# Altium footprint library EMDC_Packages.PcbLib: 274 footprints (part 2 of 18)
Each footprint in its own frame and in the unit in brackets; x right, y up, seen from the top. Pads: shape width x height; smd on the part's side, far side on the other; paste and mask are expansions set on the pad; w line width, h text height; cw(c..) or ccw(c..) is an arc to the next point about the centre after c.
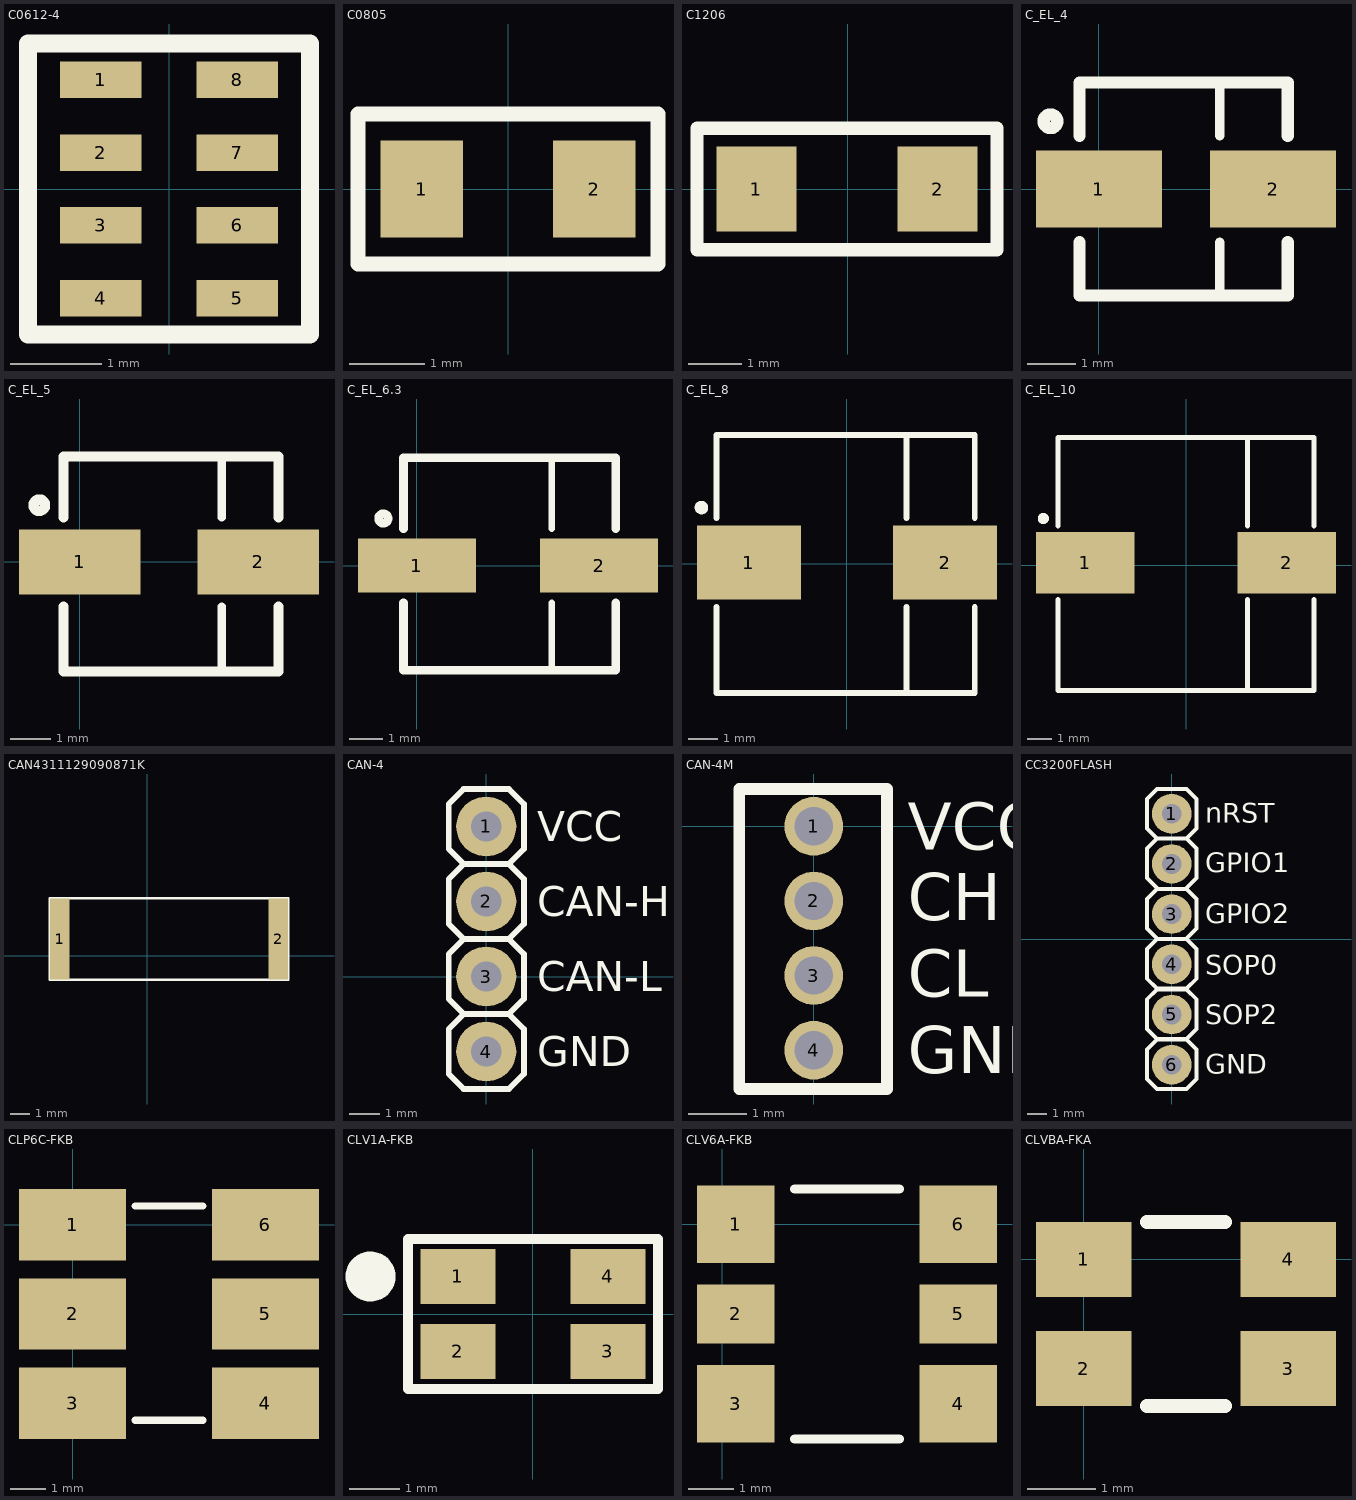
[diagram p1: the footprints below, top view; thin cyan lines are the x and y axes]

## C0612-4 [mm] "Capacitor array (4 caps)"
pads (8):
  rect 0.9x0.4 smd: 1(-0.75,1.2) 2(-0.75,0.4) 3(-0.75,-0.4) 4(-0.75,-1.2) 5(0.75,-1.2) 6(0.75,-0.4) 7(0.75,0.4) 8(0.75,1.2)
Top Overlay:
  lines w0.2: -1.55,-1.6 1.55,-1.6 1.55,1.6 -1.55,1.6 -1.55,-1.6
3D body "User Library-Array-1206-4Way-Var1.STEP": height 0.5, standoff 0, extent -0.8,-1.6 0.8,1.6

## C0805 [mm]
pads (2):
  rect 1.1x1.3 smd: 1(-1.15,0) 2(1.15,0)
Top Overlay:
  lines w0.2: -2,-1 2,-1 2,1 -2,1 -2,-1
3D body "User Library-CRS0805.STEP": height 0.5, standoff 0, extent -1,-0.625 1,0.625

## C1206 [mm]
pads (2):
  rect 1.52x1.6 smd: 1(-1.725,0) 2(1.7,0)
Top Overlay:
  lines w0.254: -2.85,-1.15 2.825,-1.15 2.825,1.15 -2.85,1.15 -2.85,-1.15
3D body "User Library-Chip Cap_MLCC_1206 (3216)_C.STEP": height 0.95, standoff 0, extent -1.6,-0.8 1.6,0.8

## C_EL_4 [mm]
pads (2):
  rect 2.6x1.6 smd: 1(0,0) 2(3.6,0)
Top Overlay:
  circle w0.254: c-1,1.4 r0.141
  lines w0.2: 2.5,-2.2 2.5,-1.1 ; 2.5,1.1 2.5,2.2
  lines w0.254: 3.9,-1.1 3.9,-2.2 -0.4,-2.2 -0.4,-1.1 ; 3.9,1.1 3.9,2.2 -0.4,2.2 -0.4,1.1 ; -0.4,-1.1 -0.4,-1.1 ; -0.4,1.1 -0.4,1.1
3D body "User Library-CAPSMD4x3_9.STEP": height 3.91, standoff 0, extent -0.55,-2.175 4.05,2.125

## C_EL_5 [mm]
pads (2):
  rect 3x1.6 smd: 1(0,0) 2(4.4,0)
Top Overlay:
  circle w0.254: c-1,1.4 r0.141
  lines w0.2: 3.5,-2.7 3.5,-1.1 ; 3.5,1.1 3.5,2.6
  lines w0.254: 4.9,-1.1 4.9,-2.7 -0.4,-2.7 -0.4,-1.1 ; 4.9,1.1 4.9,2.6 -0.4,2.6 -0.4,1.1 ; -0.4,-1.1 -0.4,-1.1 ; -0.4,1.1 -0.4,1.1
3D body "User Library-CAP SMD SVP 5_0x5_9.STEP": height 5.9, standoff 0, extent -0.8,-2.65 5.2,2.65

## C_EL_6.3 [mm]
pads (2):
  rect 3.5x1.6 smd: 1(0,0) 2(5.4,0)
Top Overlay:
  circle w0.254: c-1,1.4 r0.141
  lines w0.2: 4,-3.1 4,-1.1 ; 4,1.1 4,3.2
  lines w0.254: -0.4,-1.1 -0.4,-3.1 5.9,-3.1 5.9,-1.1 ; -0.4,1.1 -0.4,3.2 5.9,3.2 5.9,1.1
3D body "User Library-CEL63D66S8H.STEP": height 7.9, standoff 0.2, extent -0.775,-3.3 6.225,3.3

## C_EL_8 [mm]
pads (2):
  rect 3.5x2.5 smd: 1(-3.3,0.05) 2(3.3,0.05)
Top Overlay:
  circle w0.254: c-4.9,1.9 r0.1
  lines w0.2: -4.4,-1.45 -4.4,-4.35 4.3,-4.35 4.3,-1.45 ; -4.4,1.55 -4.4,4.35 4.3,4.35 4.3,1.55 ; 2,-4.35 2,-1.45 ; 2,1.55 2,4.35
3D body "User Library-CAP SMD SVP 8_0x6_9.STEP": height 6.9, standoff 0, extent -4.5,-4.15 4.5,4.15

## C_EL_10 [mm]
pads (2):
  rect 4x2.5 smd: 1(-4.1,0.1) 2(4.1,0.1)
Top Overlay:
  circle w0.254: c-5.8,1.9 r0.1
  lines w0.2: -5.2,-1.4 -5.2,-5.1 5.2,-5.1 5.2,-1.4 ; -5.2,1.6 -5.2,5.2 5.2,5.2 5.2,1.6 ; 2.5,-5.1 2.5,-1.4 ; 2.5,1.6 2.5,5.2
3D body "User Library-CAP SMD SVP 10_0x12_6.STEP": height 12.6, standoff 0, extent -5.5,-5.15 5.5,5.15

## CAN4311129090871K [mm]
pads (2):
  rect 1x4.25 smd: 1(-4.575,0.875) 2(6.825,0.875)
Top Overlay:
  lines w0.15: -5.075,-1.25 7.325,-1.25 7.325,3 -5.075,3 -5.075,-1.25
3D body "User Library-Yageo ANT1204LL08R0870A Ceramic Chip Antenna.step": height 1.6, standoff 0, extent -4.925,-1.175 7.175,2.925

## CAN-4 [mm]
pads (4):
  round 2 hole 1: 1(0,5) 2(0,2.5) 3(0,0) 4(0,-2.5)
Top Overlay:
  lines w0.2: -0.75,-1.25 0.75,-1.25 ; -0.75,-1.25 -1.25,-0.75 -1.25,0.75 -0.75,1.25 ; -0.75,-1.25 -1.25,-1.75 -1.25,-3.25 -0.75,-3.75 0.75,-3.75 1.25,-3.25 1.25,-1.75 0.75,-1.25 ; -0.75,1.25 -1.25,1.75 -1.25,3.25 -0.75,3.75 ; -0.75,1.25 0.75,1.25 ; -0.75,3.75 0.75,3.75 ; -0.75,3.75 -1.25,4.25 -1.25,5.75 -0.75,6.25 0.75,6.25 1.25,5.75 1.25,4.25 0.75,3.75 ; 0.75,-1.25 1.25,-0.75 1.25,0.75 0.75,1.25 ; 0.75,1.25 1.25,1.75 1.25,3.25 0.75,3.75
  text "GND" at 1.7,-3 h1
  text "CAN-L" at 1.7,-0.5 h1
  text "VCC" at 1.7,4.5 h1
  text "CAN-H" at 1.7,2 h1
3D body "User Library-PLS-1.STEP": height 8.44, standoff -3, extent -1.27,-3.77 1.27,-1.23
3D body "User Library-PLS-1.STEP": height 8.44, standoff -3, extent -1.27,-1.27 1.27,1.27
3D body "User Library-PLS-1.STEP": height 8.44, standoff -3, extent -1.27,1.23 1.27,3.77
3D body "User Library-PLS-1.STEP": height 8.44, standoff -3, extent -1.27,3.73 1.27,6.27

## CAN-4M [mm]
pads (4):
  round 1 hole 0.65: 1(0,0) 2(0,-1.27) 3(0,-2.54) 4(0,-3.81)
Top Overlay:
  lines w0.2: -1.27,-4.47 1.245,-4.47 1.245,0.635 -1.27,0.635 -1.27,-4.47
  text "VCC" at 1.6,-0.4 h0.8
  text "CH" at 1.6,-1.6 h0.8
  text "CL" at 1.6,-2.9 h0.8
  text "GND" at 1.6,-4.2 h0.8
3D body "PLL-2.stp": height 5.2, standoff -2.9, extent -1.1,-4.64 1.1,-1.69
3D body "PLL-2.stp": height 5.2, standoff -2.9, extent -1.1,-2.1 1.1,0.85

## CC3200FLASH [mm]
pads (6):
  round 2 hole 1: 1(0,6.35) 2(0,3.81) 3(0,1.27) 4(0,-1.27) 5(0,-3.81) 6(0,-6.35)
Top Overlay:
  lines w0.2: -0.75,0.04 -1.25,0.54 -1.25,2.04 -0.75,2.54 0.75,2.54 1.25,2.04 1.25,0.54 0.75,0.04 ; -0.75,2.6 -1.25,3.1 -1.25,4.6 -0.75,5.1 ; 0.75,2.6 1.25,3.1 1.25,4.6 0.75,5.1 ; -0.75,5.1 -1.25,5.6 -1.25,7.1 -0.75,7.6 0.75,7.6 1.25,7.1 1.25,5.6 0.75,5.1 ; -0.75,5.1 0.75,5.1 ; -1.25,-7.08 -1.25,-5.58 -0.75,-5.08 0.75,-5.08 1.25,-5.58 1.25,-7.08 0.75,-7.58 -0.75,-7.58 -1.25,-7.08 ; -1.25,-4.54 -0.75,-5.04 0.75,-5.04 1.25,-4.54 1.25,-3.04 0.75,-2.54 -0.75,-2.54 -1.25,-3.04 -1.25,-4.54 ; -1.25,-2 -1.25,-0.5 -0.75,0 0.75,0 1.25,-0.5 1.25,-2 0.75,-2.5 -0.75,-2.5 -1.25,-2
  text "GND" at 1.7,-6.8 h1
  text "SOP2" at 1.7,-4.3 h1
  text "SOP0" at 1.7,-1.8 h1
  text "GPIO2" at 1.7,0.8 h1
  text "GPIO1" at 1.7,3.4 h1
  text "nRST" at 1.7,5.9 h1
3D body "User Library-PLS-1.STEP": height 8.44, standoff -3, extent -1.27,5.08 1.27,7.62
3D body "User Library-PLS-1.STEP": height 8.44, standoff -3, extent -1.27,2.54 1.27,5.08
3D body "User Library-PLS-1.STEP": height 8.44, standoff -3, extent -1.27,0 1.27,2.54
3D body "User Library-PLS-1.STEP": height 8.44, standoff -3, extent -1.27,-2.54 1.27,0
3D body "User Library-PLS-1.STEP": height 8.44, standoff -3, extent -1.27,-5.08 1.27,-2.54
3D body "User Library-PLS-1.STEP": height 8.44, standoff -3, extent -1.27,-7.62 1.27,-5.08

## CLP6C-FKB [mm] "RGB LED Cree CLP6C-FKB"
pads (6):
  rect 3x2 smd: 1(0,0) 2(0,-2.5) 3(0,-5) 4(5.4,-5) 5(5.4,-2.5) 6(5.4,0)
Top Overlay:
  lines w0.2: 1.75,-5.475 3.65,-5.475 ; 1.75,0.525 3.65,0.525

## CLV1A-FKB [mm] "RGB LED Cree CLV1A-FKB"
pads (4):
  rect 1.5x1.1 smd: 1(-1.5,0.75) 2(-1.5,-0.75) 3(1.5,-0.75) 4(1.5,0.75)
Top Overlay:
  circle w0.5: c-3.25,0.75 r0.25
  lines w0.2: -2.5,-1.5 -2.5,1.5 2.5,1.5 2.5,-1.5 -2.5,-1.5
3D body "User Library-PLCC4RGBCT-CA LED SMD RGB.step": height 1.88, standoff -0.02, extent -1.75,-1.4 1.75,1.4

## CLV6A-FKB [mm] "RGB LED Cree"
pads (6):
  rect 1.7x1.7 smd: 1(0.3,0) 3(0.3,-3.95) 4(5.2,-3.95) 6(5.2,0)
  rect 1.7x1.3 smd: 2(0.3,-1.975) 5(5.2,-1.975)
Top Overlay:
  lines w0.2: 1.6,-4.725 3.9,-4.725 ; 1.6,0.775 3.9,0.775
3D body "User Library-Cree PLCC6 LED model.STEP": height 2.6, standoff 0, extent 0,-4.7 5.5,0.8

## CLVBA-FKA [mm] "RGB LED Cree"
pads (4):
  rect 1.4x1.1 smd: 1(0,0) 2(0,-1.6) 3(3,-1.6) 4(3,0)
Top Overlay:
  lines w0.2: 0.925,-2.15 2.075,-2.15 ; 0.925,0.55 2.075,0.55